# Altium footprint library IntLib.PcbLib: 221 footprints (part 3 of 14)
Each footprint in its own frame and in the unit in brackets; x right, y up, seen from the top. Pads: shape width x height; smd on the part's side, far side on the other; paste and mask are expansions set on the pad; w line width, h text height; cw(c..) or ccw(c..) is an arc to the next point about the centre after c.
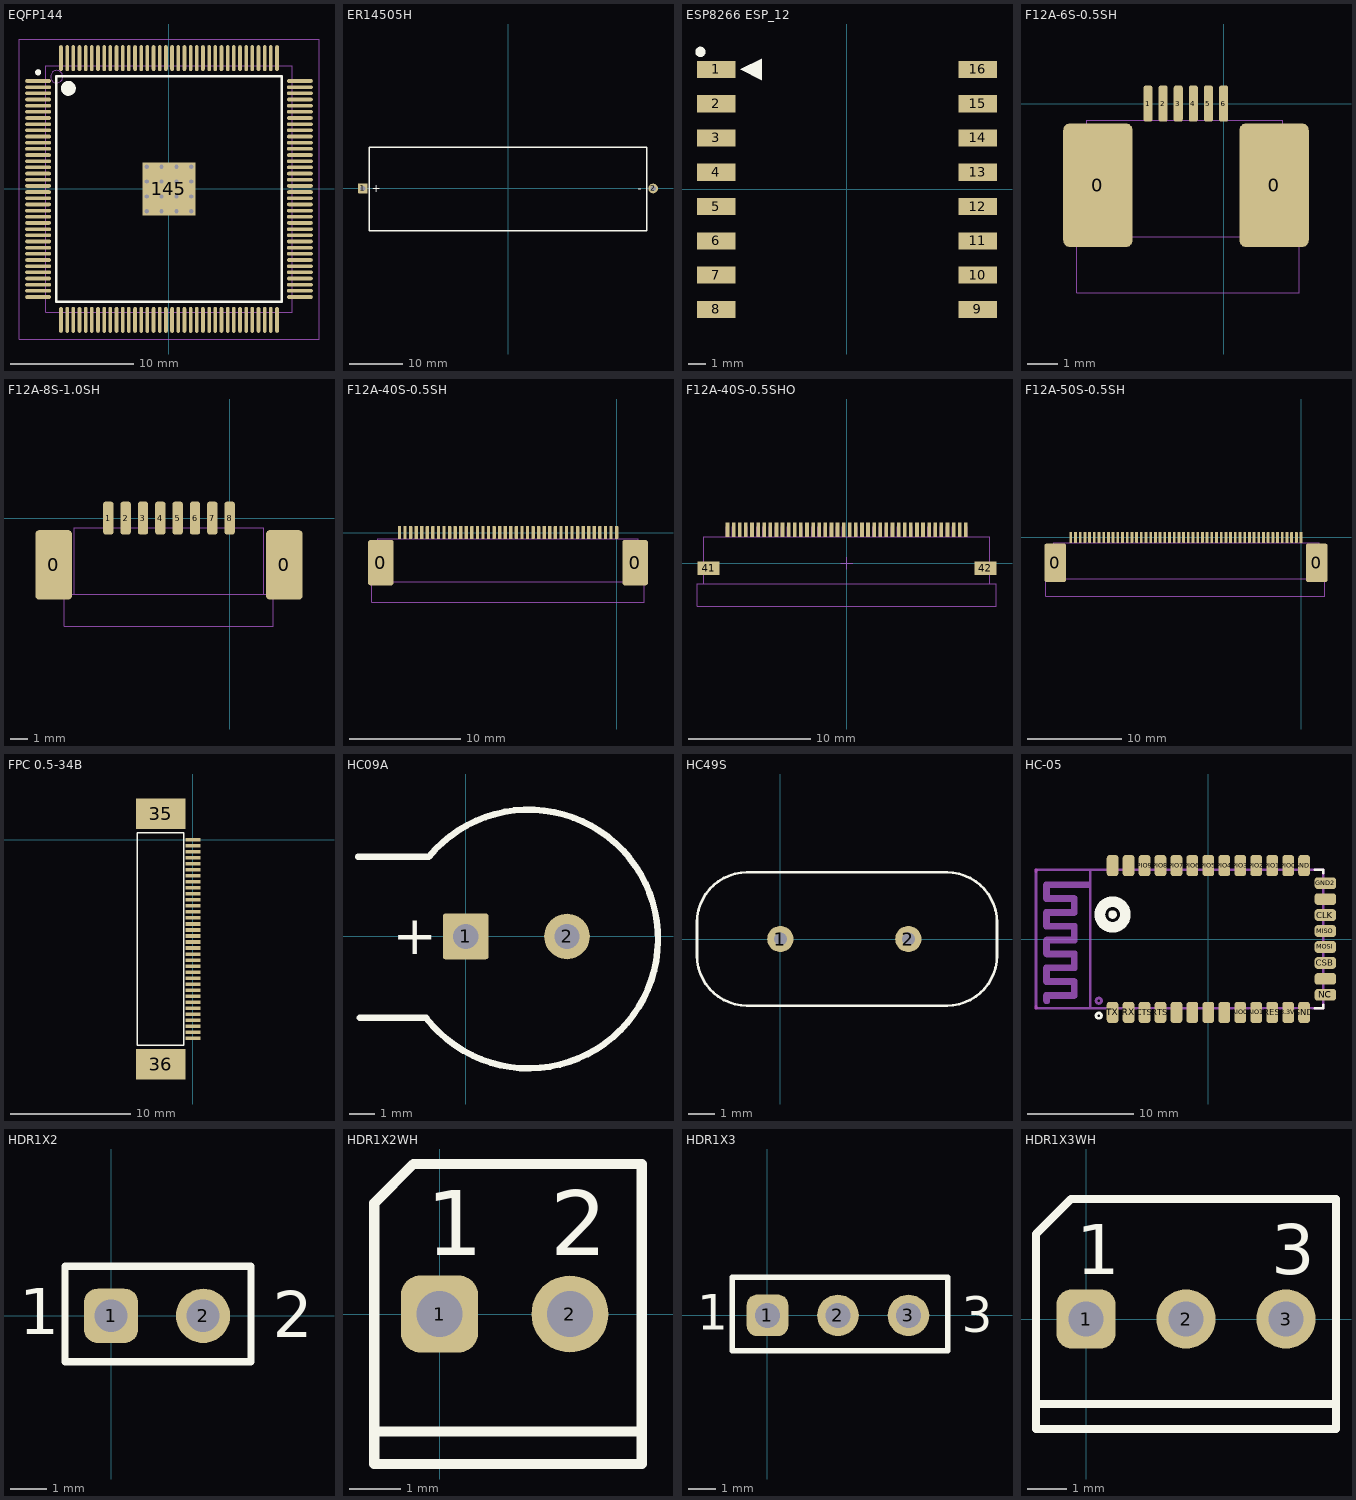
[diagram p2: the footprints below, top view; thin cyan lines are the x and y axes]

## EQFP144 [mm] "Thin QFP, 144-Leads, Body 20x20mm, Pitch 0.5mm, IPC Low Density"
height 1.6
pads (145):
  oval 2.1x0.3 smd: 1(-10.6,8.75) 2(-10.6,8.25) 3(-10.6,7.75) 4(-10.6,7.25) 5(-10.6,6.75) 6(-10.6,6.25) 7(-10.6,5.75) 8(-10.6,5.25) 9(-10.6,4.75) 10(-10.6,4.25) 11(-10.6,3.75) 12(-10.6,3.25) 13(-10.6,2.75) 14(-10.6,2.25) 15(-10.6,1.75) 16(-10.6,1.25) 17(-10.6,0.75) 18(-10.6,0.25) 19(-10.6,-0.25) 20(-10.6,-0.75) 21(-10.6,-1.25) 22(-10.6,-1.75) 23(-10.6,-2.25) 24(-10.6,-2.75) 25(-10.6,-3.25) 26(-10.6,-3.75) 27(-10.6,-4.25) 28(-10.6,-4.75) 29(-10.6,-5.25) 30(-10.6,-5.75) 31(-10.6,-6.25) 32(-10.6,-6.75) 33(-10.6,-7.25) 34(-10.6,-7.75) 35(-10.6,-8.25) 36(-10.6,-8.75) 73(10.6,-8.75) 74(10.6,-8.25) 75(10.6,-7.75) 76(10.6,-7.25) 77(10.6,-6.75) 78(10.6,-6.25) 79(10.6,-5.75) 80(10.6,-5.25) 81(10.6,-4.75) 82(10.6,-4.25) 83(10.6,-3.75) 84(10.6,-3.25) 85(10.6,-2.75) 86(10.6,-2.25) 87(10.6,-1.75) 88(10.6,-1.25) 89(10.6,-0.75) 90(10.6,-0.25) 91(10.6,0.25) 92(10.6,0.75) 93(10.6,1.25) 94(10.6,1.75) 95(10.6,2.25) 96(10.6,2.75) 97(10.6,3.25) 98(10.6,3.75) 99(10.6,4.25) 100(10.6,4.75) 101(10.6,5.25) 102(10.6,5.75) 103(10.6,6.25) 104(10.6,6.75) 105(10.6,7.25) 106(10.6,7.75) 107(10.6,8.25) 108(10.6,8.75)
  oval 0.3x2.1 smd: 37(-8.75,-10.6) 38(-8.25,-10.6) 39(-7.75,-10.6) 40(-7.25,-10.6) 41(-6.75,-10.6) 42(-6.25,-10.6) 43(-5.75,-10.6) 44(-5.25,-10.6) 45(-4.75,-10.6) 46(-4.25,-10.6) 47(-3.75,-10.6) 48(-3.25,-10.6) 49(-2.75,-10.6) 50(-2.25,-10.6) 51(-1.75,-10.6) 52(-1.25,-10.6) 53(-0.75,-10.6) 54(-0.25,-10.6) 55(0.25,-10.6) 56(0.75,-10.6) 57(1.25,-10.6) 58(1.75,-10.6) 59(2.25,-10.6) 60(2.75,-10.6) 61(3.25,-10.6) 62(3.75,-10.6) 63(4.25,-10.6) 64(4.75,-10.6) 65(5.25,-10.6) 66(5.75,-10.6) 67(6.25,-10.6) 68(6.75,-10.6) 69(7.25,-10.6) 70(7.75,-10.6) 71(8.25,-10.6) 72(8.75,-10.6) 109(8.75,10.6) 110(8.25,10.6) 111(7.75,10.6) 112(7.25,10.6) 113(6.75,10.6) 114(6.25,10.6) 115(5.75,10.6) 116(5.25,10.6) 117(4.75,10.6) 118(4.25,10.6) 119(3.75,10.6) 120(3.25,10.6) 121(2.75,10.6) 122(2.25,10.6) 123(1.75,10.6) 124(1.25,10.6) 125(0.75,10.6) 126(0.25,10.6) 127(-0.25,10.6) 128(-0.75,10.6) 129(-1.25,10.6) 130(-1.75,10.6) 131(-2.25,10.6) 132(-2.75,10.6) 133(-3.25,10.6) 134(-3.75,10.6) 135(-4.25,10.6) 136(-4.75,10.6) 137(-5.25,10.6) 138(-5.75,10.6) 139(-6.25,10.6) 140(-6.75,10.6) 141(-7.25,10.6) 142(-7.75,10.6) 143(-8.25,10.6) 144(-8.75,10.6)
  rect 4.3x4.3 smd: 145(0,0)
via 1.8,-1.8 diameter 0.66 hole 0.33
via 0.6,-1.8 diameter 0.66 hole 0.33
via -0.6,-1.8 diameter 0.66 hole 0.33
via -1.8,-1.8 diameter 0.66 hole 0.33
via 1.8,-0.6 diameter 0.66 hole 0.33
via 0.6,-0.6 diameter 0.66 hole 0.33
via -0.6,-0.6 diameter 0.66 hole 0.33
via -1.8,-0.6 diameter 0.66 hole 0.33
via 1.8,0.6 diameter 0.66 hole 0.33
via 0.6,0.6 diameter 0.66 hole 0.33
via -0.6,0.6 diameter 0.66 hole 0.33
via -1.8,0.6 diameter 0.66 hole 0.33
via 1.8,1.8 diameter 0.66 hole 0.33
via 0.6,1.8 diameter 0.66 hole 0.33
via -0.6,1.8 diameter 0.66 hole 0.33
via -1.8,1.8 diameter 0.66 hole 0.33
Top Overlay:
  circle w0.25: c-10.6,9.45 r0.125
  circle w0.6: c-8.15,8.15 r0.3
  lines w0.2: -9.15,-9.15 -9.15,9.15 9.15,9.15 9.15,-9.15 -9.15,-9.15
Mechanical 13:
  circle w0.1: c-9.1,9.1 r0.5
  lines w0.1: -10,-10 -10,10 10,10 10,-10 -10,-10
Mechanical 15:
  lines w0.1: -0.5,0 0.5,0 ; 0,-0.5 0,0.5 ; -12.15,-12.15 -12.15,12.15 12.15,12.15 12.15,-12.15 -12.15,-12.15
3D body: height 1.6, standoff 0.05, extent -10,-10 10,10

## ER14505H [mm] "ER14505H"
pads (2):
  rrect10% 1.8x1.8 hole 1: 1(-27,0)
  round 1.8 hole 1: 2(27,0)
Top Overlay:
  lines w0.254: -25.8,-7.9 -25.8,7.7 25.8,7.7 25.8,-7.9 -25.8,-7.9
  text "+" at -25.3,-0.7 h1.52
  text "-" at 24.1,-0.7 h1.52
3D body: height 15.19, standoff 0.75, extent -25.25,-7.3 25.25,7.171

## ESP8266 ESP_12 [mm] "ESP8266 ESP-07"
height 3.2
pads (16):
  rect 2.25x1 smd: 1(-7.625,7) 2(-7.625,5) 3(-7.625,3) 4(-7.625,1) 5(-7.625,-1) 6(-7.625,-3) 7(-7.625,-5) 8(-7.625,-7) 9(7.625,-7) 10(7.625,-5) 11(7.625,-3) 12(7.625,-1) 13(7.625,1) 14(7.625,3) 15(7.625,5) 16(7.625,7)
Top Overlay:
  circle w0.3: c-8.55,8.025 r0.15
  region: -6.23,7 -4.96,6.365 -4.96,7.635
3D body: height 3.6, standoff -0.05, extent -7.898,-8.509 8.102,12.691

## F12A-6S-0.5SH [mm]
pads (8):
  rrect20% 2.3x4.1 smd: 0(-4.156,-2.7) 0(1.67,-2.7)
  rrect50% 0.3x1.2 smd: 1(-2.5,0) 2(-2,0) 3(-1.5,0) 4(-1,0) 5(-0.5,0) 6(0,0)
Mechanical 1:
  lines w0.01: -4.521,-4.4 -4.521,-0.55 1.95,-0.55 1.95,-4.4 ; -4.851,-6.25 -4.851,-4.4 2.5,-4.4 2.5,-6.25 -4.851,-6.25
3D body: height 1.2, standoff -0.02, extent -3.745,-3.305 1.255,-0.305

## F12A-8S-1.0SH [mm]
pads (10):
  rrect20% 2.1x4 smd: 0(-10.15,-2.7) 0(3.15,-2.7)
  rrect50% 0.6x1.9 smd: 1(-7,0) 2(-6,0) 3(-5,0) 4(-4,0) 5(-3,0) 6(-2,0) 7(-1,0) 8(0,0)
Mechanical 1:
  lines w0.01: -8.966,-4.4 -8.966,-0.55 1.95,-0.55 1.95,-4.4 ; -9.55,-6.25 2.5,-6.25 2.5,-4.4 -9.55,-4.4 -9.55,-6.25
3D body: height 2.7, standoff 0, extent -10.63,-8.433 3.67,0.467

## F12A-40S-0.5SH [mm]
pads (42):
  rrect20% 2.3x4.1 smd: 0(-21.177,-2.7) 0(1.67,-2.7)
  rrect50% 0.3x1.2 smd: 1(0,0) 2(-0.5,0) 3(-1,0) 4(-1.5,0) 5(-2,0) 6(-2.5,0) 7(-3,0) 8(-3.5,0) 9(-4,0) 10(-4.5,0) 11(-5,0) 12(-5.5,0) 13(-6,0) 14(-6.5,0) 15(-7,0) 16(-7.5,0) 17(-8,0) 18(-8.5,0) 19(-9,0) 20(-9.5,0) 21(-10,0) 22(-10.5,0) 23(-11,0) 24(-11.5,0) 25(-12,0) 26(-12.5,0) 27(-13,0) 28(-13.5,0) 29(-14,0) 30(-14.5,0) 31(-15,0) 32(-15.5,0) 33(-16,0) 34(-16.5,0) 35(-17,0) 36(-17.5,0) 37(-18,0) 38(-18.5,0) 39(-19,0) 40(-19.5,0)
Mechanical 1:
  lines w0.01: -21.45,-4.4 -21.45,-0.55 1.95,-0.55 1.95,-4.4 ; -22,-6.25 -22,-4.4 2.5,-4.4 2.5,-6.25 -22,-6.25
3D body: height 1.2, standoff -0.02, extent -20.775,-3.388 1.225,-0.388

## F12A-40S-0.5SHO [mm]
pads (42):
  rect 0.3x1.2 smd paste-25.4 mask-25.4: 1(9.75,2.75) 2(9.25,2.75) 3(8.75,2.75) 4(8.25,2.75) 5(7.75,2.75) 6(7.25,2.75) 7(6.75,2.75) 8(6.25,2.75) 9(5.75,2.75) 10(5.25,2.75) 11(4.75,2.75) 12(4.25,2.75) 13(3.75,2.75) 14(3.25,2.75) 15(2.75,2.75) 16(2.25,2.75) 17(1.75,2.75) 18(1.25,2.75) 19(0.75,2.75) 20(0.25,2.75) 21(-0.25,2.75) 22(-0.75,2.75) 23(-1.25,2.75) 24(-1.75,2.75) 25(-2.25,2.75) 26(-2.75,2.75) 27(-3.25,2.75) 28(-3.75,2.75) 29(-4.25,2.75) 30(-4.75,2.75) 31(-5.25,2.75) 32(-5.75,2.75) 33(-6.25,2.75) 34(-6.75,2.75) 35(-7.25,2.75) 36(-7.75,2.75) 37(-8.25,2.75) 38(-8.75,2.75) 39(-9.25,2.75) 40(-9.75,2.75)
  rect 1.8x1.1 smd paste-25.4 mask-25.4: 41(-11.3,-0.4) 42(11.35,-0.4)
Top Paste:
  drawing of 42 lines, arcs and shapes, not listed
Top Solder:
  drawing of 42 lines, arcs and shapes, not listed
Mechanical 1:
  drawing of 177 lines, arcs and shapes, not listed
3D body: height 1.2, standoff -0.02, extent -11.025,-0.638 10.975,2.362

## F12A-50S-0.5SH [mm]
pads (52):
  rrect20% 2.3x4.1 smd: 0(-26.156,-2.7) 0(1.67,-2.7)
  rrect50% 0.3x1.2 smd: 1(0,0) 2(-0.5,0) 3(-1,0) 4(-1.5,0) 5(-2,0) 6(-2.5,0) 7(-3,0) 8(-3.5,0) 9(-4,0) 10(-4.5,0) 11(-5,0) 12(-5.5,0) 13(-6,0) 14(-6.5,0) 15(-7,0) 16(-7.5,0) 17(-8,0) 18(-8.5,0) 19(-9,0) 20(-9.5,0) 21(-10,0) 22(-10.5,0) 23(-11,0) 24(-11.5,0) 25(-12,0) 26(-12.5,0) 27(-13,0) 28(-13.5,0) 29(-14,0) 30(-14.5,0) 31(-15,0) 32(-15.5,0) 33(-16,0) 34(-16.5,0) 35(-17,0) 36(-17.5,0) 37(-18,0) 38(-18.5,0) 39(-19,0) 40(-19.5,0) 41(-20,0) 42(-20.5,0) 43(-21,0) 44(-21.5,0) 45(-22,0) 46(-22.5,0) 47(-23,0) 48(-23.5,0) 49(-24,0) 50(-24.5,0)
Mechanical 1:
  lines w0.01: -26.34,-4.4 -26.34,-0.55 1.95,-0.55 1.95,-4.4 ; -27.178,-6.25 -27.178,-4.4 2.5,-4.4 2.5,-6.25 -27.178,-6.25
3D body: height 2, standoff -0.05, extent -27.503,-7.131 2.997,0.019

## FPC 0.5-34B [mm]
pads (36):
  rect 1.25x0.3 smd paste-25.4 mask-25.4: 1(0,-0.001) 2(0,-0.501) 3(0,-1.001) 4(0,-1.501) 5(0,-2.001) 6(0,-2.501) 7(0,-3.001) 8(0,-3.501) 9(0,-4.001) 10(0,-4.501) 11(0,-5.001) 12(0,-5.501) 13(0,-6.001) 14(0,-6.501) 15(0,-7.001) 16(0,-7.501) 17(0,-8.001) 18(0,-8.501) 19(0,-9.001) 20(0,-9.501) 21(0,-10.001) 22(0,-10.501) 23(0,-11.001) 24(0,-11.501) 25(0,-12.001) 26(0,-12.501) 27(0,-13.001) 28(0,-13.501) 29(0,-14.001) 30(0,-14.501) 31(0,-15.001) 32(0,-15.501) 33(0,-16.001) 34(0,-16.501)
  rect 4.1x2.5 smd: 35(-2.67,2.15) 36(-2.67,-18.65)
Top Overlay:
  lines w0.127: -4.617,-17.051 -4.617,0.549 ; -4.612,-17.05 -0.75,-17.051 -0.75,0.549 -4.612,0.547
Top Paste:
  drawing of 34 lines, arcs and shapes, not listed
Top Solder:
  region: -0.75,-12.671 0.75,-12.671 0.75,-12.331 -0.75,-12.331
  region: -0.75,-2.171 0.75,-2.171 0.75,-1.831 -0.75,-1.831
  region: -0.75,-0.171 0.75,-0.171 0.75,0.169 -0.75,0.169
  region: -0.75,-0.671 0.75,-0.671 0.75,-0.331 -0.75,-0.331
  region: -0.75,-1.171 0.75,-1.171 0.75,-0.831 -0.75,-0.831
  region: -0.75,-1.671 0.75,-1.671 0.75,-1.331 -0.75,-1.331
  region: -0.75,-3.171 0.75,-3.171 0.75,-2.831 -0.75,-2.831
  region: -0.75,-3.671 0.75,-3.671 0.75,-3.331 -0.75,-3.331
  region: -0.75,-4.671 0.75,-4.671 0.75,-4.331 -0.75,-4.331
  region: -0.75,-4.171 0.75,-4.171 0.75,-3.831 -0.75,-3.831
  region: -0.75,-2.671 0.75,-2.671 0.75,-2.331 -0.75,-2.331
  region: -0.75,-7.671 0.75,-7.671 0.75,-7.331 -0.75,-7.331
  region: -0.75,-5.671 0.75,-5.671 0.75,-5.331 -0.75,-5.331
  region: -0.75,-5.171 0.75,-5.171 0.75,-4.831 -0.75,-4.831
  region: -0.75,-6.171 0.75,-6.171 0.75,-5.831 -0.75,-5.831
  region: -0.75,-6.671 0.75,-6.671 0.75,-6.331 -0.75,-6.331
  region: -0.75,-7.171 0.75,-7.171 0.75,-6.831 -0.75,-6.831
  region: -0.75,-8.171 0.75,-8.171 0.75,-7.831 -0.75,-7.831
  region: -0.75,-8.671 0.75,-8.671 0.75,-8.331 -0.75,-8.331
  region: -0.75,-9.171 0.75,-9.171 0.75,-8.831 -0.75,-8.831
  region: -0.75,-9.671 0.75,-9.671 0.75,-9.331 -0.75,-9.331
  region: -0.75,-11.671 0.75,-11.671 0.75,-11.331 -0.75,-11.331
  region: -0.75,-11.171 0.75,-11.171 0.75,-10.831 -0.75,-10.831
  region: -0.75,-12.171 0.75,-12.171 0.75,-11.831 -0.75,-11.831
  region: -0.75,-10.671 0.75,-10.671 0.75,-10.331 -0.75,-10.331
  region: -0.75,-10.171 0.75,-10.171 0.75,-9.831 -0.75,-9.831
  region: -0.75,-16.671 0.75,-16.671 0.75,-16.331 -0.75,-16.331
  region: -0.75,-15.171 0.75,-15.171 0.75,-14.831 -0.75,-14.831
  region: -0.75,-13.171 0.75,-13.171 0.75,-12.831 -0.75,-12.831
  region: -0.75,-14.171 0.75,-14.171 0.75,-13.831 -0.75,-13.831
  region: -0.75,-13.671 0.75,-13.671 0.75,-13.331 -0.75,-13.331
  region: -0.75,-14.671 0.75,-14.671 0.75,-14.331 -0.75,-14.331
  region: -0.75,-15.671 0.75,-15.671 0.75,-15.331 -0.75,-15.331
  region: -0.75,-16.171 0.75,-16.171 0.75,-15.831 -0.75,-15.831

## HC09A [mm] "BUZZER"
height 5
pads (2):
  rrect10% 1.8x1.8 hole 1: 1(0,0)
  round 1.8 hole 1: 2(4,0)
Top Overlay:
  lines w0.254: -4.248,3.143 -1.454,3.143 cw(c2.487,-0.101) -1.557,-3.216 -4.171,-3.217
  text "+" at -2.87,-0.711 h1.52
3D body: height 5.01, standoff -3, extent -4.255,-4.75 6.745,4.75

## HC49S [mm] "Quartz"
height 3.6
pads (2):
  round 1 hole 0.5: 1(0,0) 2(4.877,0)
Top Overlay:
  lines w0.1: -3.175,-0.635 ccw(c-1.27,-0.635) -1.27,-2.54 6.35,-2.54 ccw(c6.35,-0.635) 8.255,-0.635 8.255,0.635 ccw(c6.35,0.635) 6.35,2.54 -1.27,2.54 ccw(c-1.27,0.635) -3.175,0.635 -3.175,-0.635
3D body: height 5.23, standoff -0.37, extent -3.07,-2.311 8.103,2.362

## HC-05 [mm] "BT HC-05 WAVESEN"
pads (34):
  rrect50% 1.1x2 smd: 3.3V(7.5,-6.9) AIO0(3,-6.9) AIO1(4.5,-6.9) CTS(-6,-6.9) GND(9,-6.9) GND1(9,6.9) PCM_CLK(-3,-6.9) PCM_IN(0,-6.9) PCM_OUT(-1.5,-6.9) PCM_SYNC(1.5,-6.9) PIO0(7.5,6.9) PIO1(6,6.9) PIO2(4.5,6.9) PIO3(3,6.9) PIO4(1.5,6.9) PIO5(0,6.9) PIO6(-1.5,6.9) PIO7(-3,6.9) PIO8(-4.5,6.9) PIO9(-6,6.9) PIO10(-7.5,6.9) PIO11(-9,6.9) RES(6,-6.9) RTS(-4.5,-6.9) RX(-7.5,-6.9) TX(-9,-6.9)
  rrect50% 2x1.1 smd: CLK(11,2.25) CSB(11,-2.25) GND2(11,5.25) MISO(11,0.75) MOSI(11,-0.75) NC(11,-5.25) USB_DM(11,-3.75) USB_DP(11,3.75)
Top Overlay:
  circle w0.254: c-10.3,-7.2 r0.254
  circle w0.4: c-9,2.3 r0.2
  circle w1: c-9,2.3 r1.2
  lines w0.254: 10,-6.5 10.8,-6.5 10.8,-6.2 ; 10,6.5 10.8,6.5 10.8,6.2
Keep-Out Layer:
  lines w0.254: -16.2,-6.5 -16.2,-6.4 ; -16.2,6.4 -16.2,6.5
Mechanical 1:
  drawing of 75 lines, arcs and shapes, not listed
3D body: height 2.35, standoff 0, extent -17.221,-7.01 10.789,7.01

## HDR1X2 [mm] "Connector; Header; 2x1 Position"
pads (2):
  rrect50% 1.5x1.5 hole 0.9: 1(0,0)
  round 1.5 hole 0.9: 2(2.54,0)
Top Overlay:
  lines w0.2: -1.27,-1.27 -1.27,1.372 3.861,1.372 3.861,-1.27 0.635,-1.27 -1.27,-1.27
  text "1" at -2.54,-0.508 h1.27
  text "2" at 4.47,-0.584 h1.27
3D body: height 8.54, standoff -2, extent -1.245,-1.245 3.835,1.295

## HDR1X2WH [mm] "Connector; Header; 2x1 Position"
pads (2):
  rrect50% 1.5x1.5 hole 0.9: 1(0,0)
  round 1.5 hole 0.9: 2(2.54,0)
Top Overlay:
  lines w0.2: -1.27,-2.286 3.937,-2.286 ; -1.27,-2.921 3.937,-2.921 3.937,2.921 -0.508,2.921 -1.27,2.159 -1.27,-2.921
  text "1" at -0.254,1.143 h1.27
  text "2" at 2.159,1.143 h1.27
3D body: height 11.75, standoff -3.49, extent -1.27,-2.921 3.81,2.921

## HDR1X3 [mm] "Connector; Header; 3x1 Position"
pads (3):
  rrect50% 1.5x1.5 hole 0.9: 1(0,0)
  round 1.5 hole 0.9: 2(2.54,0) 3(5.08,0)
Top Overlay:
  lines w0.2: -1.27,-1.27 0.635,-1.27 6.5,-1.27 6.5,1.372 -1.27,1.372 -1.27,-1.27
  text "3" at 7,-0.6 h1.27
  text "1" at -2.54,-0.508 h1.27
3D body: height 8.54, standoff -3, extent -1.21,-1.3 6.41,1.24

## HDR1X3WH [mm] "Connector; Header; 3x1 Position"
pads (3):
  rrect50% 1.5x1.5 hole 0.9: 1(0,0)
  round 1.5 hole 0.9: 2(2.54,0) 3(5.08,0)
Top Overlay:
  lines w0.2: -1.27,-2.159 6.35,-2.159 ; -1.27,-2.794 -1.27,2.159 -0.381,3.048 6.35,3.048 6.35,-2.794 -1.27,-2.794
  text "1" at -0.254,1.143 h1.27
  text "3" at 4.699,1.143 h1.27
3D body: height 11.75, standoff -3.49, extent -1.27,-2.794 6.35,3.048